# Altium footprint library Miscellaneous.PcbLib: 139 footprints (part 6 of 9)
Each footprint in its own frame and in the unit in brackets; x right, y up, seen from the top. Pads: shape width x height; smd on the part's side, far side on the other; paste and mask are expansions set on the pad; w line width, h text height; cw(c..) or ccw(c..) is an arc to the next point about the centre after c.
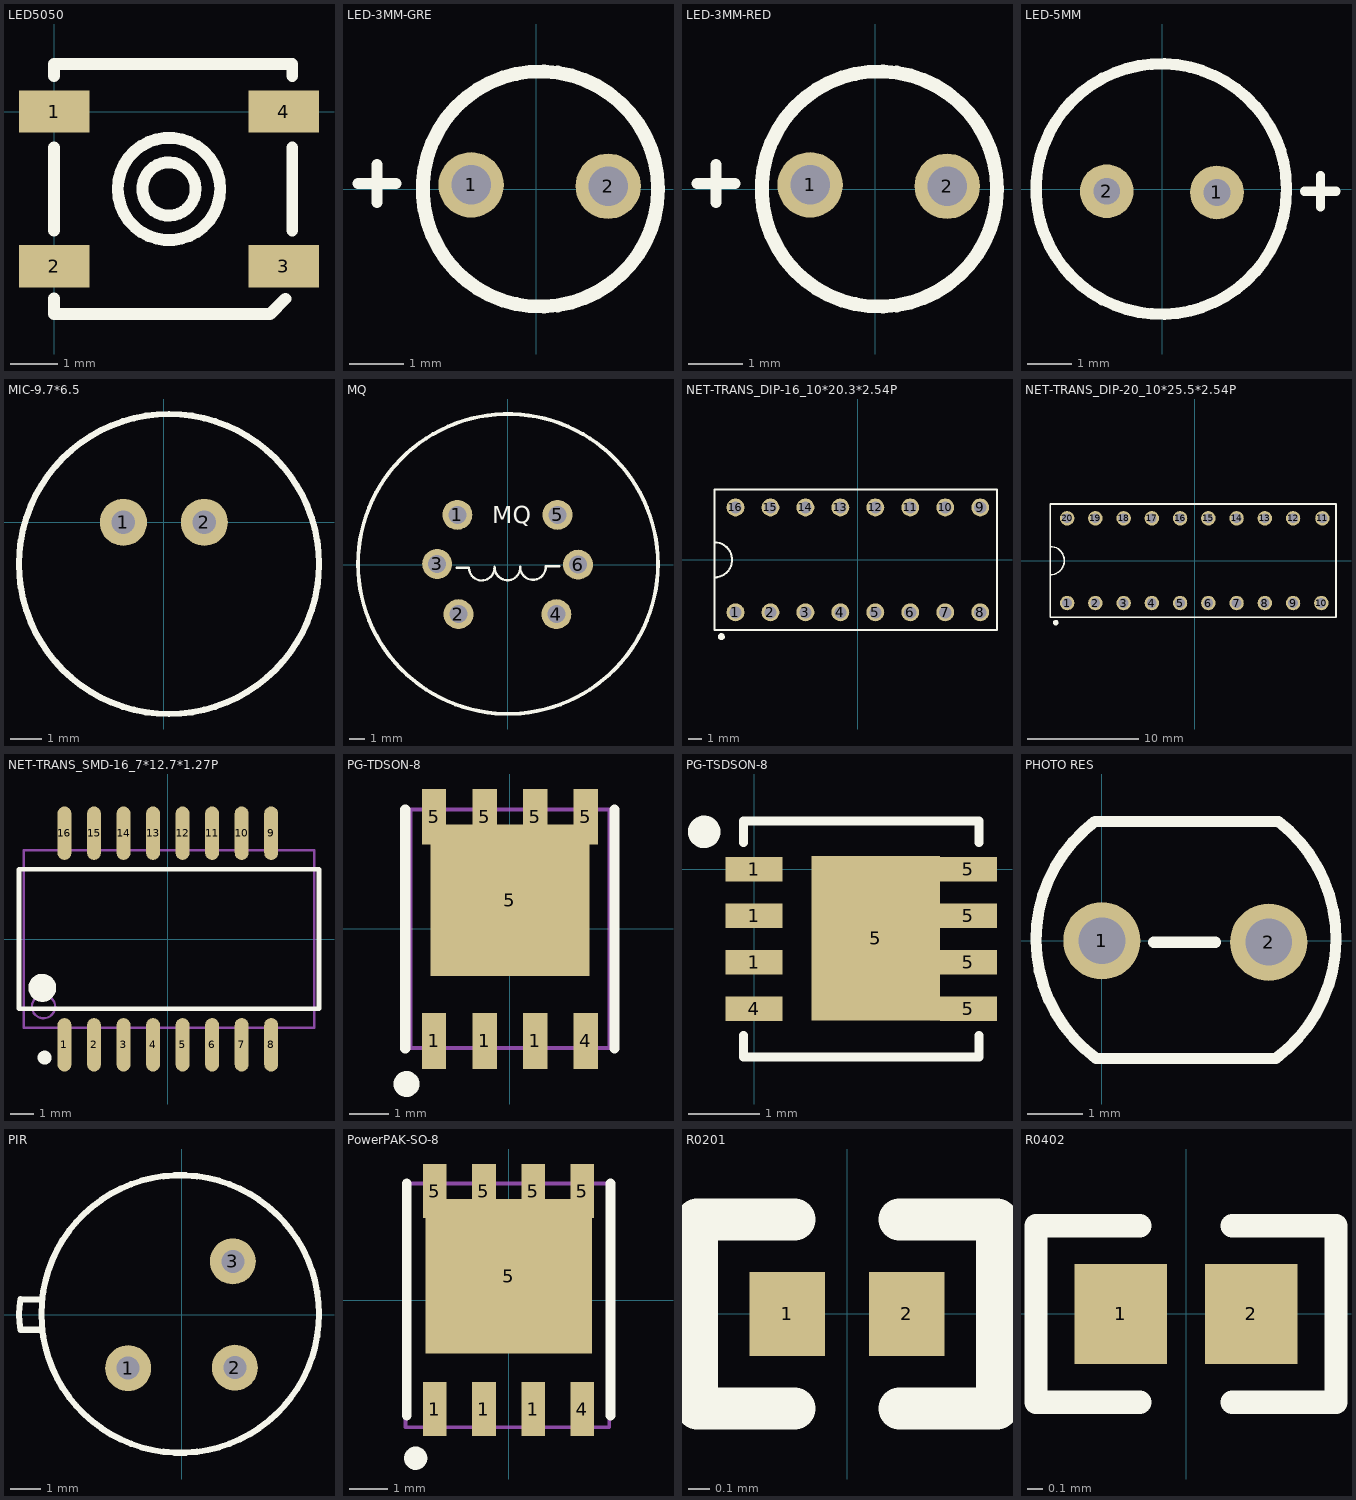
[diagram p5: the footprints below, top view; thin cyan lines are the x and y axes]

## LED5050 [mm]
pads (4):
  rect 1.5x0.9 smd: 1(0,0) 2(0,-3.3) 3(4.9,-3.3) 4(4.9,0)
Top Overlay:
  circle w0.254: c2.45,-1.65 r0.568
  circle w0.254: c2.45,-1.65 r1.092
  lines w0.254: 0,-3.988 0,-4.318 4.228,-4.318 4.608,-4.318 4.933,-3.993 ; 0,-2.54 0,-0.762 ; 0,0.762 0,1.016 5.08,1.016 5.08,0.762 ; 5.08,-2.54 5.08,-0.762
3D body "User Library-APA102C.step": height 1.53, standoff -0.02, extent -0.235,-4.162 5.265,0.838

## LED-3MM-GRE [mm]
pads (2):
  round 1.2 hole 0.72: 1(-1.194,0.076) 2(1.321,0.051)
Top Overlay:
  circle w0.254: c0.076,0 r2.159
  lines w0.203: -3.271,0.101 -2.921,0.101 ; -2.921,-0.249 -2.921,0.101 ; -2.921,0.451 -2.921,0.101 ; -2.571,0.101 -2.921,0.101
3D body "SW3dPS-LEDd3G.STEP": height 5.51, standoff -2.49, extent -1.588,-1.572 1.712,1.716

## LED-3MM-RED [mm]
pads (2):
  round 1.2 hole 0.72: 1(-1.194,0.076) 2(1.321,0.051)
Top Overlay:
  circle w0.254: c0.076,0 r2.159
  lines w0.203: -3.271,0.101 -2.921,0.101 ; -2.921,-0.249 -2.921,0.101 ; -2.921,0.451 -2.921,0.101 ; -2.571,0.101 -2.921,0.101
3D body "CircuitWorks-LED DIP 3MM.step": height 5.74, standoff -2.76, extent -1.798,-1.849 1.702,1.951

## LED-5MM [mm]
pads (2):
  round 1.2 hole 0.6: 1(1.219,-0.076) 2(-1.245,-0.051)
Top Overlay:
  circle w0.254: c-0.025,0 r2.8
  lines w0.203: 3.18,-0.05 3.53,-0.05 ; 3.53,-0.4 3.53,-0.05 ; 3.53,0.3 3.53,-0.05 ; 3.88,-0.05 3.53,-0.05
3D body "User Library-810409.step": height 8.89, standoff -14.99, extent -2.718,-2.718 2.667,2.667

## MIC-9.7*6.5 [mil]
pads (2):
  round 60 hole 30: 1(-51.5,0) 2(51.5,0)
Top Overlay:
  circle w8: c6.5,-53 r190.94

## MQ [mm]
pads (6):
  round 2 hole 1.2: 1(-3.353,3.315) 2(-3.277,-3.315) 3(-4.699,0.038) 4(3.251,-3.315) 5(3.327,3.315) 6(4.699,-0.013)
Top Overlay:
  circle w0.254: c0.025,0.038 r10
  lines w0.152: -3.404,-0.216 -2.576,-0.216 ccw(c-1.727,-0.216) -0.88,-0.155 ; -3.378,-3.315 -3.327,-3.315 ; -0.857,-0.2 ccw(c-0.009,-0.2) 0.838,-0.14 ; 0,-9.97 0.025,-9.944 ; 0.844,-0.175 ccw(c1.693,-0.175) 2.54,-0.114 3.454,-0.114 ; 7.061,7.074 7.061,7.099
  text "MQ" at -1.041,2.756 h1.14
3D body "User Library-MQ135.step": height 14, standoff -7.5, extent -9.775,-9.763 9.725,9.737

## NET-TRANS_DIP-16_10*20.3*2.54P [mm]
pads (16):
  round 1.3 hole 0.88: 1(-8.89,-3.81) 2(-6.35,-3.81) 3(-3.81,-3.81) 4(-1.27,-3.81) 5(1.27,-3.81) 6(3.81,-3.81) 7(6.35,-3.81) 8(8.89,-3.81) 9(8.89,3.81) 10(6.35,3.81) 11(3.81,3.81) 12(1.27,3.81) 13(-1.27,3.81) 14(-3.81,3.81) 15(-6.35,3.81) 16(-8.89,3.81)
Top Overlay:
  lines w0.152: -10.41,-1.275 ccw(c-10.41,0) -10.41,1.275 ; -10.41,-5.1 10.11,-5.1 10.11,5.1 -10.41,5.1 -10.41,-5.1
  lines w0.254: -9.798,-5.519 ccw(c-9.91,-5.575) -9.785,-5.575

## NET-TRANS_DIP-20_10*25.5*2.54P [mm]
pads (20):
  round 1.3 hole 0.88: 1(-11.48,-3.81) 2(-8.94,-3.81) 3(-6.4,-3.81) 4(-3.86,-3.81) 5(-1.32,-3.81) 6(1.22,-3.81) 7(3.76,-3.81) 8(6.3,-3.81) 9(8.84,-3.81) 10(11.38,-3.81) 11(11.48,3.81) 12(8.84,3.81) 13(6.3,3.81) 14(3.76,3.81) 15(1.22,3.81) 16(-1.32,3.81) 17(-3.86,3.81) 18(-6.4,3.81) 19(-8.94,3.81) 20(-11.48,3.81)
Top Overlay:
  lines w0.152: -13,-1.275 ccw(c-13,0) -13,1.275 ; -13,-5.1 12.7,-5.1 12.7,5.1 -13,5.1 -13,-5.1
  lines w0.254: -12.388,-5.519 ccw(c-12.5,-5.575) -12.375,-5.575

## NET-TRANS_SMD-16_7*12.7*1.27P [mm]
pads (16):
  oval 0.6x2.3 smd: 1(-4.445,-4.55) 2(-3.175,-4.55) 3(-1.905,-4.55) 4(-0.635,-4.55) 5(0.635,-4.55) 6(1.905,-4.55) 7(3.175,-4.55) 8(4.445,-4.55) 9(4.445,4.55) 10(3.175,4.55) 11(1.905,4.55) 12(0.635,4.55) 13(-0.635,4.55) 14(-1.905,4.55) 15(-3.175,4.55) 16(-4.445,4.55)
Top Overlay:
  circle w0.6: c-5.4,-2.1 r0.3
  circle w0.3: c-5.3,-5.1 r0.15
  lines w0.2: -6.4,-3 6.5,-3 6.5,3 -6.4,3 -6.4,-3
Mechanical 13:
  circle w0.1: c-5.345,-2.91 r0.5
  lines w0.1: -6.2,-3.81 6.3,-3.81 6.3,3.81 -6.2,3.81 -6.2,-3.81

## PG-TDSON-8 [mm]
pads (9):
  rect 0.61x1.4 smd: 1(-1.905,-2.816) 1(-0.635,-2.816) 1(0.635,-2.816) 4(1.905,-2.816) 5(-1.905,2.816) 5(-0.635,2.816) 5(0.635,2.816) 5(1.905,2.816)
  rect 4x3.81 smd: 5(0,0.716)
Top Overlay:
  circle w0.4: c-2.6,-3.9 r0.125
  lines w0.254: -2.63,-3 -2.63,3 ; 2.63,-3 2.63,3
Mechanical 13:
  lines w0.1: -2.5,-3 2.5,-3 2.5,3 -2.5,3 -2.5,-3
3D body "User Library-son_1p27-6x5x1p10-5_8n.step": height 1.1, standoff 0, extent -2.549,-2.999 2.601,3.151

## PG-TSDSON-8 [mm]
pads (9):
  rect 0.8x0.34 smd: 1(0,-1.3) 1(0,-0.65) 1(0,0) 4(0,-1.95) 5(3,-1.95) 5(3,-1.3) 5(3,-0.65) 5(3,0)
  rect 1.8x2.3 smd: 5(1.702,-0.965)
Top Overlay:
  circle w0.254: c-0.7,0.525 r0.1
  lines w0.127: -0.15,-2.325 -0.15,-2.625 3.15,-2.625 3.15,-2.325 ; -0.15,0.375 -0.15,0.675 3.15,0.675 3.15,0.375
3D body "User Library-PG-TSDSON-8-1.STEP": height 1.11, standoff 0, extent -0.201,-2.667 3.199,0.733

## PHOTO RES [mm]
pads (2):
  round 1.4 hole 0.85: 1(0,0) 2(3.023,-0.025)
Top Overlay:
  lines w0.203: -0.127,2.159 3.175,2.159 ; -0.127,2.16 ccw(c1.479,0.022) -0.102,-2.134 3.099,-2.134 ; 0.94,-0.025 2.057,-0.025 ; 3.15,-2.134 ccw(c1.549,0.032) 3.2,2.159
3D body "Photoresistor.STEP": height 4.06, standoff -5.84, extent -0.813,-1.956 3.81,1.956

## PIR [mil]
pads (3):
  round 60 hole 30: 1(-69.65,-69.65) 2(69.65,-68.94) 3(66.82,69.65)
Top Overlay:
  circle w8: c-1.77,1.06 r181.1
  lines w8: -210.17,-19.42 cw(c-110.54,0.23) -210.07,20.39 ; -210.09,-19.47 -184.79,-19.47 ; -210.08,20.39 -184.08,20.05
3D body "User Library-PIR_S_Orginal.step": height 185.04, standoff -78.74, extent -254.58,-252.73 251.25,253.09

## PowerPAK-SO-8 [mm]
pads (9):
  rect 0.61x1.4 smd: 1(-1.905,-2.816) 1(-0.635,-2.816) 1(0.635,-2.816) 4(1.905,-2.816) 5(-1.905,2.816) 5(-0.635,2.816) 5(0.635,2.816) 5(1.905,2.816)
  rect 4.3x4 smd: 5(0,0.616)
Top Overlay:
  circle w0.3: c-2.4,-4.084 r0.15
  lines w0.254: -2.63,-2.984 -2.63,3.016 ; 2.63,-2.984 2.63,3.016
Mechanical 13:
  lines w0.1: -2.66,-3.284 2.6,-3.284 2.6,3.016 -2.66,3.016 -2.66,-3.284
3D body "User Library-PowerPAK SO-8 (S).STEP": height 1.04, standoff 0, extent -2.575,-3.184 2.575,2.966

## R0201 [mm]
pads (2):
  rect 0.36x0.4 smd mask+0.051: 1(-0.285,0) 2(0.285,0)
Top Overlay:
  lines w0.2: -0.25,-0.45 -0.715,-0.45 -0.715,0.45 -0.25,0.45 ; 0.25,-0.45 0.715,-0.45 0.715,0.45 0.25,0.45
3D body "User Library-RES_0603-0201.STEP": height 0.34, standoff 0, extent -0.34,-0.165 0.34,0.165

## R0402 [mm]
pads (2):
  rect 0.6x0.65 smd mask+0.051: 1(-0.425,0) 2(0.425,0)
Top Overlay:
  lines w0.152: -0.3,-0.575 -0.975,-0.575 -0.975,0.575 -0.3,0.575 ; 0.3,-0.575 0.975,-0.575 0.975,0.575 0.3,0.575
3D body "User Library-RES_1005-0402.STEP": height 0.41, standoff 0, extent -0.575,-0.275 0.575,0.275